# Altium footprint library Package_DFN_QFN.PcbLib: 557 footprints (part 9 of 35)
Each footprint in its own frame and in the unit in brackets; x right, y up, seen from the top. Pads: shape width x height; smd on the part's side, far side on the other; paste and mask are expansions set on the pad; w line width, h text height; cw(c..) or ccw(c..) is an arc to the next point about the centre after c.
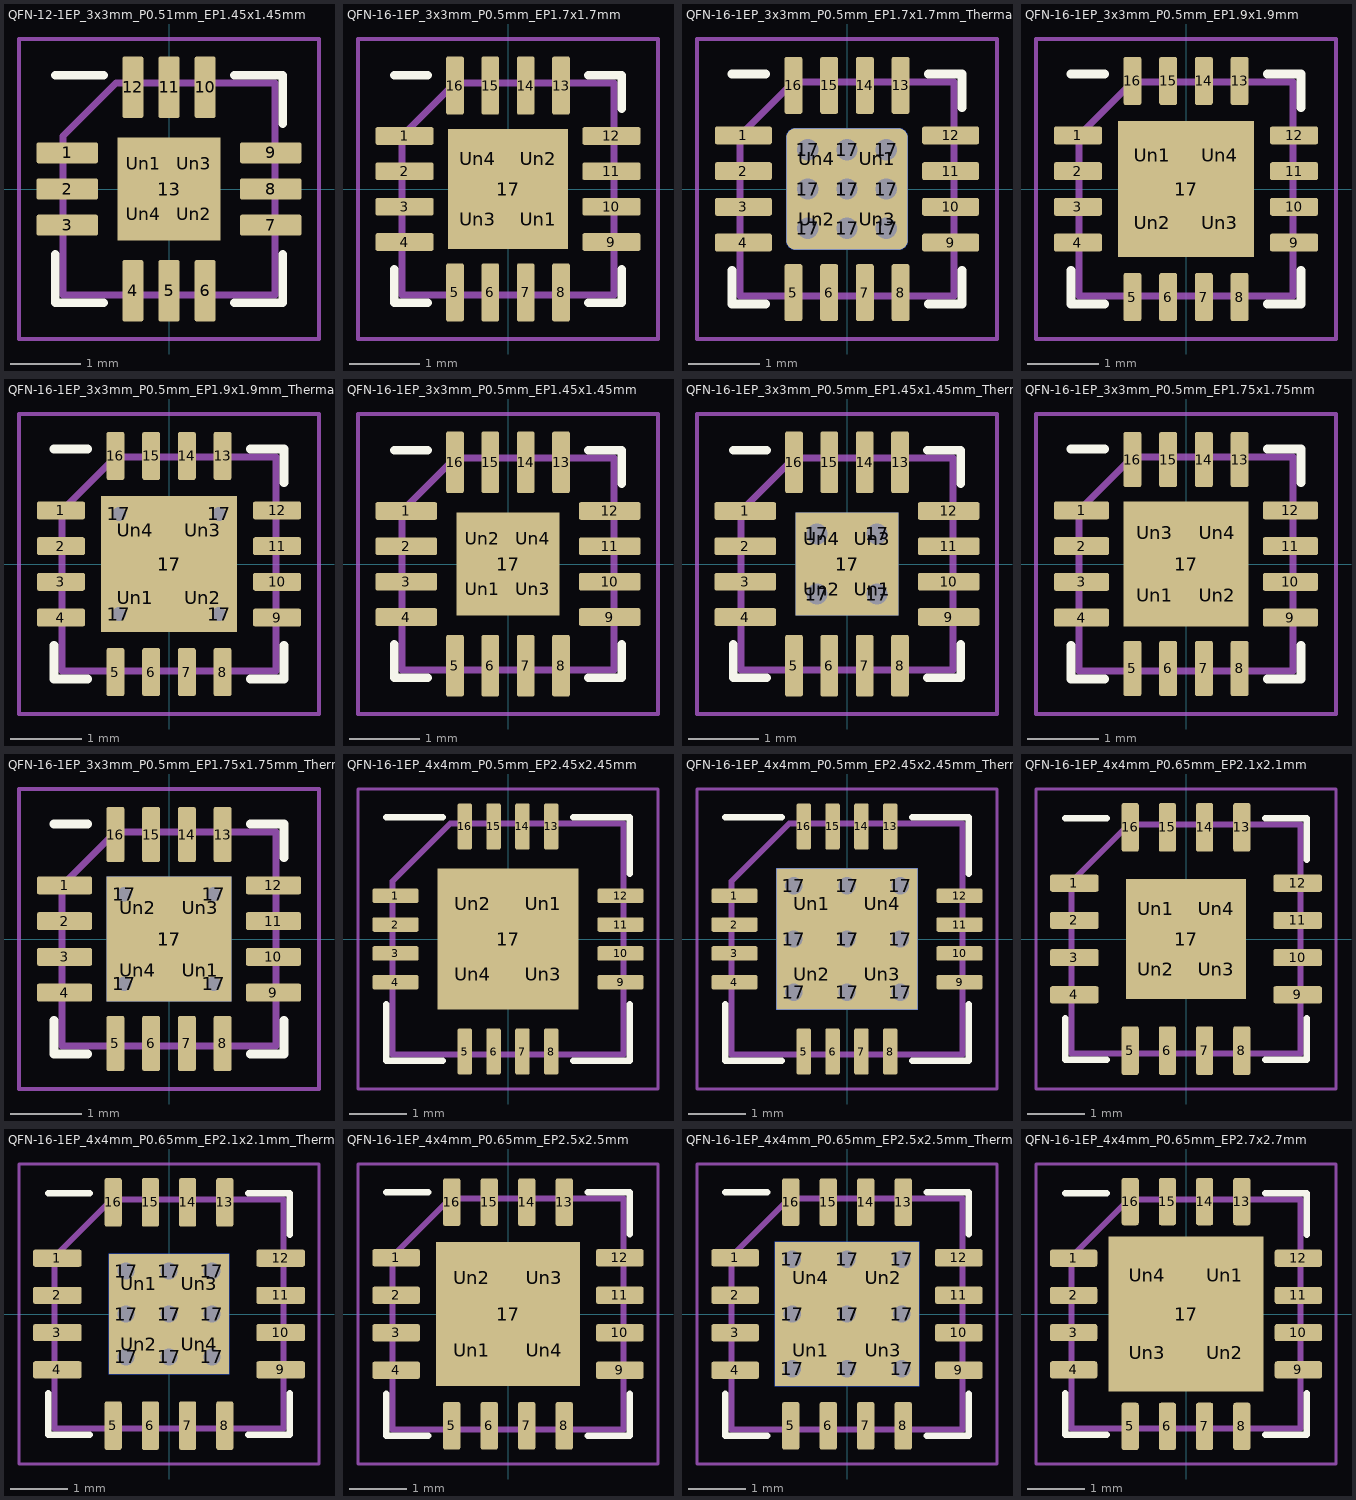
[diagram p8: the footprints below, top view; thin cyan lines are the x and y axes]

## QFN-12-1EP_3x3mm_P0.51mm_EP1.45x1.45mm [mm]
pads (17):
  rrect25% 0.875x0.3 smd: 1(-1.438,0.51) 2(-1.438,0) 3(-1.438,-0.51) 7(1.438,-0.51) 8(1.438,0) 9(1.438,0.51)
  rrect25% 0.3x0.875 smd: 4(-0.51,-1.438) 5(0,-1.438) 6(0.51,-1.438) 10(0.51,1.438) 11(0,1.438) 12(-0.51,1.438)
  rect 1.45x1.45 smd: 13(0,0)
  rrect25% 0.58x0.58 on Top Paste: Un1(-0.36,0.36) Un2(0.36,-0.36) Un3(0.36,0.36) Un4(-0.36,-0.36)
F.SilkS:
  lines w0.12: -1.61,-0.92 -1.61,-1.61 -0.92,-1.61 ; -1.61,1.61 -0.92,1.61 ; 0.92,-1.61 1.61,-1.61 1.61,-0.92 ; 0.92,1.61 1.61,1.61 1.61,0.92
F.CrtYd:
  lines w0.05: -2.12,-2.12 -2.12,2.12 2.12,2.12 2.12,-2.12 -2.12,-2.12
F.Fab:
  lines w0.1: -1.5,-1.5 -1.5,0.75 -0.75,1.5 1.5,1.5 1.5,-1.5 -1.5,-1.5
  text "'.Designator'" at -3.033,-0.628 h0.75

## QFN-16-1EP_3x3mm_P0.5mm_EP1.7x1.7mm [mm]
pads (21):
  rrect25% 0.825x0.25 smd: 1(-1.462,0.75) 2(-1.462,0.25) 3(-1.462,-0.25) 4(-1.462,-0.75) 9(1.462,-0.75) 10(1.462,-0.25) 11(1.462,0.25) 12(1.462,0.75)
  rrect25% 0.25x0.825 smd: 5(-0.75,-1.462) 6(-0.25,-1.462) 7(0.25,-1.462) 8(0.75,-1.462) 13(0.75,1.462) 14(0.25,1.462) 15(-0.25,1.462) 16(-0.75,1.462)
  rect 1.7x1.7 smd: 17(0,0)
  rrect25% 0.69x0.69 on Top Paste: Un1(0.425,-0.425) Un2(0.425,0.425) Un3(-0.425,-0.425) Un4(-0.425,0.425)
F.SilkS:
  lines w0.12: -1.61,-1.135 -1.61,-1.61 -1.135,-1.61 ; -1.61,1.61 -1.135,1.61 ; 1.135,-1.61 1.61,-1.61 1.61,-1.135 ; 1.135,1.61 1.61,1.61 1.61,1.135
F.CrtYd:
  lines w0.05: -2.12,-2.12 -2.12,2.12 2.12,2.12 2.12,-2.12 -2.12,-2.12
F.Fab:
  lines w0.1: -1.5,-1.5 -1.5,0.75 -0.75,1.5 1.5,1.5 1.5,-1.5 -1.5,-1.5
  text "'.Designator'" at -3.033,-0.628 h0.75

## QFN-16-1EP_3x3mm_P0.5mm_EP1.7x1.7mm_ThermalVias [mm]
pads (31):
  rrect25% 0.8x0.25 smd: 1(-1.45,0.75) 2(-1.45,0.25) 3(-1.45,-0.25) 4(-1.45,-0.75) 9(1.45,-0.75) 10(1.45,-0.25) 11(1.45,0.25) 12(1.45,0.75)
  rrect25% 0.25x0.8 smd: 5(-0.75,-1.45) 6(-0.25,-1.45) 7(0.25,-1.45) 8(0.75,-1.45) 13(0.75,1.45) 14(0.25,1.45) 15(-0.25,1.45) 16(-0.75,1.45)
  round 0.6 hole 0.3: 17(-0.55,-0.55) 17(-0.55,0) 17(-0.55,0.55) 17(0,-0.55) 17(0,0) 17(0,0.55) 17(0.55,-0.55) 17(0.55,0) 17(0.55,0.55)
  rrect15% 1.7x1.7 smd far side: 17(0,0)
  rrect15% 1.7x1.7 smd: 17(0,0)
  rrect25% 0.74x0.74 on Top Paste: Un1(0.425,0.425) Un2(-0.425,-0.425) Un3(0.425,-0.425) Un4(-0.425,0.425)
F.SilkS:
  lines w0.12: -1.61,-1.135 -1.61,-1.61 -1.135,-1.61 ; -1.61,1.61 -1.135,1.61 ; 1.135,-1.61 1.61,-1.61 1.61,-1.135 ; 1.135,1.61 1.61,1.61 1.61,1.135
F.CrtYd:
  lines w0.05: -2.1,-2.1 -2.1,2.1 2.1,2.1 2.1,-2.1 -2.1,-2.1
F.Fab:
  lines w0.1: -1.5,-1.5 -1.5,0.75 -0.75,1.5 1.5,1.5 1.5,-1.5 -1.5,-1.5
  text "'.Designator'" at -3.033,-0.628 h0.75

## QFN-16-1EP_3x3mm_P0.5mm_EP1.9x1.9mm [mm]
pads (21):
  rrect25% 0.675x0.25 smd: 1(-1.512,0.75) 2(-1.512,0.25) 3(-1.512,-0.25) 4(-1.512,-0.75) 9(1.512,-0.75) 10(1.512,-0.25) 11(1.512,0.25) 12(1.512,0.75)
  rrect25% 0.25x0.675 smd: 5(-0.75,-1.512) 6(-0.25,-1.512) 7(0.25,-1.512) 8(0.75,-1.512) 13(0.75,1.512) 14(0.25,1.512) 15(-0.25,1.512) 16(-0.75,1.512)
  rect 1.9x1.9 smd: 17(0,0)
  rrect25% 0.77x0.77 on Top Paste: Un1(-0.475,0.475) Un2(-0.475,-0.475) Un3(0.475,-0.475) Un4(0.475,0.475)
F.SilkS:
  lines w0.12: -1.61,-1.135 -1.61,-1.61 -1.135,-1.61 ; -1.61,1.61 -1.135,1.61 ; 1.135,-1.61 1.61,-1.61 1.61,-1.135 ; 1.135,1.61 1.61,1.61 1.61,1.135
F.CrtYd:
  lines w0.05: -2.1,-2.1 -2.1,2.1 2.1,2.1 2.1,-2.1 -2.1,-2.1
F.Fab:
  lines w0.1: -1.5,-1.5 -1.5,0.75 -0.75,1.5 1.5,1.5 1.5,-1.5 -1.5,-1.5
  text "'.Designator'" at -3.033,-0.628 h0.75

## QFN-16-1EP_3x3mm_P0.5mm_EP1.9x1.9mm_ThermalVias [mm]
pads (26):
  rrect25% 0.675x0.25 smd: 1(-1.512,0.75) 2(-1.512,0.25) 3(-1.512,-0.25) 4(-1.512,-0.75) 9(1.512,-0.75) 10(1.512,-0.25) 11(1.512,0.25) 12(1.512,0.75)
  rrect25% 0.25x0.675 smd: 5(-0.75,-1.512) 6(-0.25,-1.512) 7(0.25,-1.512) 8(0.75,-1.512) 13(0.75,1.512) 14(0.25,1.512) 15(-0.25,1.512) 16(-0.75,1.512)
  round 0.5 hole 0.2: 17(-0.7,-0.7) 17(-0.7,0.7) 17(0.7,-0.7) 17(0.7,0.7)
  rect 1.9x1.9 smd far side: 17(0,0)
  rect 1.9x1.9 smd: 17(0,0)
  rrect25% 0.82x0.82 on Top Paste: Un1(-0.475,-0.475) Un2(0.475,-0.475) Un3(0.475,0.475) Un4(-0.475,0.475)
F.SilkS:
  lines w0.12: -1.61,-1.135 -1.61,-1.61 -1.135,-1.61 ; -1.61,1.61 -1.135,1.61 ; 1.135,-1.61 1.61,-1.61 1.61,-1.135 ; 1.135,1.61 1.61,1.61 1.61,1.135
F.CrtYd:
  lines w0.05: -2.1,-2.1 -2.1,2.1 2.1,2.1 2.1,-2.1 -2.1,-2.1
F.Fab:
  lines w0.1: -1.5,-1.5 -1.5,0.75 -0.75,1.5 1.5,1.5 1.5,-1.5 -1.5,-1.5
  text "'.Designator'" at -3.033,-0.628 h0.75

## QFN-16-1EP_3x3mm_P0.5mm_EP1.45x1.45mm [mm]
pads (21):
  rrect25% 0.875x0.25 smd: 1(-1.438,0.75) 2(-1.438,0.25) 3(-1.438,-0.25) 4(-1.438,-0.75) 9(1.438,-0.75) 10(1.438,-0.25) 11(1.438,0.25) 12(1.438,0.75)
  rrect25% 0.25x0.875 smd: 5(-0.75,-1.438) 6(-0.25,-1.438) 7(0.25,-1.438) 8(0.75,-1.438) 13(0.75,1.438) 14(0.25,1.438) 15(-0.25,1.438) 16(-0.75,1.438)
  rect 1.45x1.45 smd: 17(0,0)
  rrect25% 0.58x0.58 on Top Paste: Un1(-0.36,-0.36) Un2(-0.36,0.36) Un3(0.36,-0.36) Un4(0.36,0.36)
F.SilkS:
  lines w0.12: -1.61,-1.135 -1.61,-1.61 -1.135,-1.61 ; -1.61,1.61 -1.135,1.61 ; 1.135,-1.61 1.61,-1.61 1.61,-1.135 ; 1.135,1.61 1.61,1.61 1.61,1.135
F.CrtYd:
  lines w0.05: -2.12,-2.12 2.12,-2.12 2.12,2.12 -2.12,2.12 -2.12,-2.12
F.Fab:
  lines w0.1: -1.5,-1.5 -1.5,0.75 -0.75,1.5 1.5,1.5 1.5,-1.5 -1.5,-1.5
  text "'.Designator'" at -3.033,-0.628 h0.75

## QFN-16-1EP_3x3mm_P0.5mm_EP1.45x1.45mm_ThermalVias [mm]
pads (26):
  rrect25% 0.875x0.25 smd: 1(-1.438,0.75) 2(-1.438,0.25) 3(-1.438,-0.25) 4(-1.438,-0.75) 9(1.438,-0.75) 10(1.438,-0.25) 11(1.438,0.25) 12(1.438,0.75)
  rrect25% 0.25x0.875 smd: 5(-0.75,-1.438) 6(-0.25,-1.438) 7(0.25,-1.438) 8(0.75,-1.438) 13(0.75,1.438) 14(0.25,1.438) 15(-0.25,1.438) 16(-0.75,1.438)
  round 0.6 hole 0.3: 17(-0.425,-0.425) 17(-0.425,0.425) 17(0.425,-0.425) 17(0.425,0.425)
  rect 1.45x1.45 smd: 17(0,0)
  rect 1.45x1.45 smd far side: 17(0,0)
  rrect25% 0.63x0.63 on Top Paste: Un1(0.36,-0.36) Un2(-0.36,-0.36) Un3(0.36,0.36) Un4(-0.36,0.36)
F.SilkS:
  lines w0.12: -1.61,-1.135 -1.61,-1.61 -1.135,-1.61 ; -1.61,1.61 -1.135,1.61 ; 1.135,-1.61 1.61,-1.61 1.61,-1.135 ; 1.135,1.61 1.61,1.61 1.61,1.135
F.CrtYd:
  lines w0.05: -2.12,-2.12 -2.12,2.12 2.12,2.12 2.12,-2.12 -2.12,-2.12
F.Fab:
  lines w0.1: -1.5,-1.5 -1.5,0.75 -0.75,1.5 1.5,1.5 1.5,-1.5 -1.5,-1.5
  text "'.Designator'" at -3.033,-0.628 h0.75

## QFN-16-1EP_3x3mm_P0.5mm_EP1.75x1.75mm [mm]
pads (21):
  rrect25% 0.775x0.25 smd: 1(-1.462,0.75) 2(-1.462,0.25) 3(-1.462,-0.25) 4(-1.462,-0.75) 9(1.462,-0.75) 10(1.462,-0.25) 11(1.462,0.25) 12(1.462,0.75)
  rrect25% 0.25x0.775 smd: 5(-0.75,-1.462) 6(-0.25,-1.462) 7(0.25,-1.462) 8(0.75,-1.462) 13(0.75,1.462) 14(0.25,1.462) 15(-0.25,1.462) 16(-0.75,1.462)
  rect 1.75x1.75 smd: 17(0,0)
  rrect25% 0.71x0.71 on Top Paste: Un1(-0.44,-0.44) Un2(0.44,-0.44) Un3(-0.44,0.44) Un4(0.44,0.44)
F.SilkS:
  lines w0.12: -1.61,-1.135 -1.61,-1.61 -1.135,-1.61 ; -1.61,1.61 -1.135,1.61 ; 1.135,-1.61 1.61,-1.61 1.61,-1.135 ; 1.135,1.61 1.61,1.61 1.61,1.135
F.CrtYd:
  lines w0.05: -2.1,-2.1 -2.1,2.1 2.1,2.1 2.1,-2.1 -2.1,-2.1
F.Fab:
  lines w0.1: -1.5,-1.5 -1.5,0.75 -0.75,1.5 1.5,1.5 1.5,-1.5 -1.5,-1.5
  text "'.Designator'" at -3.033,-0.628 h0.75

## QFN-16-1EP_3x3mm_P0.5mm_EP1.75x1.75mm_ThermalVias [mm]
pads (26):
  rrect25% 0.775x0.25 smd: 1(-1.462,0.75) 2(-1.462,0.25) 3(-1.462,-0.25) 4(-1.462,-0.75) 9(1.462,-0.75) 10(1.462,-0.25) 11(1.462,0.25) 12(1.462,0.75)
  rrect25% 0.25x0.775 smd: 5(-0.75,-1.462) 6(-0.25,-1.462) 7(0.25,-1.462) 8(0.75,-1.462) 13(0.75,1.462) 14(0.25,1.462) 15(-0.25,1.462) 16(-0.75,1.462)
  round 0.5 hole 0.2: 17(-0.625,-0.625) 17(-0.625,0.625) 17(0.625,-0.625) 17(0.625,0.625)
  rect 1.75x1.75 smd: 17(0,0)
  rect 1.75x1.75 smd far side: 17(0,0)
  rrect25% 0.76x0.76 on Top Paste: Un1(0.44,-0.44) Un2(-0.44,0.44) Un3(0.44,0.44) Un4(-0.44,-0.44)
F.SilkS:
  lines w0.12: -1.61,-1.135 -1.61,-1.61 -1.135,-1.61 ; -1.61,1.61 -1.135,1.61 ; 1.135,-1.61 1.61,-1.61 1.61,-1.135 ; 1.135,1.61 1.61,1.61 1.61,1.135
F.CrtYd:
  lines w0.05: -2.1,-2.1 2.1,-2.1 2.1,2.1 -2.1,2.1 -2.1,-2.1
F.Fab:
  lines w0.1: -1.5,-1.5 -1.5,0.75 -0.75,1.5 1.5,1.5 1.5,-1.5 -1.5,-1.5
  text "'.Designator'" at -3.033,-0.628 h0.75

## QFN-16-1EP_4x4mm_P0.5mm_EP2.45x2.45mm [mm]
pads (21):
  rrect25% 0.8x0.25 smd: 1(-1.95,0.75) 2(-1.95,0.25) 3(-1.95,-0.25) 4(-1.95,-0.75) 9(1.95,-0.75) 10(1.95,-0.25) 11(1.95,0.25) 12(1.95,0.75)
  rrect25% 0.25x0.8 smd: 5(-0.75,-1.95) 6(-0.25,-1.95) 7(0.25,-1.95) 8(0.75,-1.95) 13(0.75,1.95) 14(0.25,1.95) 15(-0.25,1.95) 16(-0.75,1.95)
  rect 2.45x2.45 smd: 17(0,0)
  rrect25% 0.99x0.99 on Top Paste: Un1(0.61,0.61) Un2(-0.61,0.61) Un3(0.61,-0.61) Un4(-0.61,-0.61)
F.SilkS:
  lines w0.12: -2.11,-1.135 -2.11,-2.11 -1.135,-2.11 ; -2.11,2.11 -1.135,2.11 ; 1.135,-2.11 2.11,-2.11 2.11,-1.135 ; 1.135,2.11 2.11,2.11 2.11,1.135
F.CrtYd:
  lines w0.05: -2.6,-2.6 2.6,-2.6 2.6,2.6 -2.6,2.6 -2.6,-2.6
F.Fab:
  lines w0.1: -2,-2 -2,1 -1,2 2,2 2,-2 -2,-2
  text "'.Designator'" at -4.047,-0.84 h1

## QFN-16-1EP_4x4mm_P0.5mm_EP2.45x2.45mm_ThermalVias [mm]
pads (31):
  rrect25% 0.8x0.25 smd: 1(-1.95,0.75) 2(-1.95,0.25) 3(-1.95,-0.25) 4(-1.95,-0.75) 9(1.95,-0.75) 10(1.95,-0.25) 11(1.95,0.25) 12(1.95,0.75)
  rrect25% 0.25x0.8 smd: 5(-0.75,-1.95) 6(-0.25,-1.95) 7(0.25,-1.95) 8(0.75,-1.95) 13(0.75,1.95) 14(0.25,1.95) 15(-0.25,1.95) 16(-0.75,1.95)
  round 0.6 hole 0.3: 17(-0.925,-0.925) 17(-0.925,0) 17(-0.925,0.925) 17(0,-0.925) 17(0,0) 17(0,0.925) 17(0.925,-0.925) 17(0.925,0) 17(0.925,0.925)
  rect 2.45x2.45 smd far side: 17(0,0)
  rect 2.45x2.45 smd: 17(0,0)
  rrect24% 1.06x1.06 on Top Paste: Un1(-0.61,0.61) Un2(-0.61,-0.61) Un3(0.61,-0.61) Un4(0.61,0.61)
F.SilkS:
  lines w0.12: -2.11,-1.135 -2.11,-2.11 -1.135,-2.11 ; -2.11,2.11 -1.135,2.11 ; 1.135,-2.11 2.11,-2.11 2.11,-1.135 ; 1.135,2.11 2.11,2.11 2.11,1.135
F.CrtYd:
  lines w0.05: -2.6,-2.6 -2.6,2.6 2.6,2.6 2.6,-2.6 -2.6,-2.6
F.Fab:
  lines w0.1: -2,-2 -2,1 -1,2 2,2 2,-2 -2,-2
  text "'.Designator'" at -4.047,-0.84 h1

## QFN-16-1EP_4x4mm_P0.65mm_EP2.1x2.1mm [mm]
pads (21):
  rrect25% 0.85x0.3 smd: 1(-1.95,0.975) 2(-1.95,0.325) 3(-1.95,-0.325) 4(-1.95,-0.975) 9(1.95,-0.975) 10(1.95,-0.325) 11(1.95,0.325) 12(1.95,0.975)
  rrect25% 0.3x0.85 smd: 5(-0.975,-1.95) 6(-0.325,-1.95) 7(0.325,-1.95) 8(0.975,-1.95) 13(0.975,1.95) 14(0.325,1.95) 15(-0.325,1.95) 16(-0.975,1.95)
  rect 2.1x2.1 smd: 17(0,0)
  rrect25% 0.85x0.85 on Top Paste: Un1(-0.525,0.525) Un2(-0.525,-0.525) Un3(0.525,-0.525) Un4(0.525,0.525)
F.SilkS:
  lines w0.12: -2.11,-1.385 -2.11,-2.11 -1.385,-2.11 ; -2.11,2.11 -1.385,2.11 ; 1.385,-2.11 2.11,-2.11 2.11,-1.385 ; 1.385,2.11 2.11,2.11 2.11,1.385
F.CrtYd:
  lines w0.05: -2.62,-2.62 -2.62,2.62 2.62,2.62 2.62,-2.62 -2.62,-2.62
F.Fab:
  lines w0.1: -2,-2 -2,1 -1,2 2,2 2,-2 -2,-2
  text "'.Designator'" at -4.047,-0.84 h1

## QFN-16-1EP_4x4mm_P0.65mm_EP2.1x2.1mm_ThermalVias [mm]
pads (31):
  rrect25% 0.85x0.3 smd: 1(-1.95,0.975) 2(-1.95,0.325) 3(-1.95,-0.325) 4(-1.95,-0.975) 9(1.95,-0.975) 10(1.95,-0.325) 11(1.95,0.325) 12(1.95,0.975)
  rrect25% 0.3x0.85 smd: 5(-0.975,-1.95) 6(-0.325,-1.95) 7(0.325,-1.95) 8(0.975,-1.95) 13(0.975,1.95) 14(0.325,1.95) 15(-0.325,1.95) 16(-0.975,1.95)
  round 0.6 hole 0.3: 17(-0.75,-0.75) 17(-0.75,0) 17(-0.75,0.75) 17(0,-0.75) 17(0,0) 17(0,0.75) 17(0.75,-0.75) 17(0.75,0) 17(0.75,0.75)
  rect 2.1x2.1 smd far side: 17(0,0)
  rect 2.1x2.1 smd: 17(0,0)
  rrect25% 0.91x0.91 on Top Paste: Un1(-0.525,0.525) Un2(-0.525,-0.525) Un3(0.525,0.525) Un4(0.525,-0.525)
F.SilkS:
  lines w0.12: -2.11,-1.385 -2.11,-2.11 -1.385,-2.11 ; -2.11,2.11 -1.385,2.11 ; 1.385,-2.11 2.11,-2.11 2.11,-1.385 ; 1.385,2.11 2.11,2.11 2.11,1.385
F.CrtYd:
  lines w0.05: -2.62,-2.62 2.62,-2.62 2.62,2.62 -2.62,2.62 -2.62,-2.62
F.Fab:
  lines w0.1: -2,-2 -2,1 -1,2 2,2 2,-2 -2,-2
  text "'.Designator'" at -4.047,-0.84 h1

## QFN-16-1EP_4x4mm_P0.65mm_EP2.5x2.5mm [mm]
pads (21):
  rrect25% 0.825x0.3 smd: 1(-1.937,0.975) 2(-1.937,0.325) 3(-1.937,-0.325) 4(-1.937,-0.975) 9(1.937,-0.975) 10(1.937,-0.325) 11(1.937,0.325) 12(1.937,0.975)
  rrect25% 0.3x0.825 smd: 5(-0.975,-1.937) 6(-0.325,-1.937) 7(0.325,-1.937) 8(0.975,-1.937) 13(0.975,1.937) 14(0.325,1.937) 15(-0.325,1.937) 16(-0.975,1.937)
  rect 2.5x2.5 smd: 17(0,0)
  rrect25% 1.01x1.01 on Top Paste: Un1(-0.625,-0.625) Un2(-0.625,0.625) Un3(0.625,0.625) Un4(0.625,-0.625)
F.SilkS:
  lines w0.12: -2.11,-1.385 -2.11,-2.11 -1.385,-2.11 ; -2.11,2.11 -1.385,2.11 ; 1.385,-2.11 2.11,-2.11 2.11,-1.385 ; 1.385,2.11 2.11,2.11 2.11,1.385
F.CrtYd:
  lines w0.05: -2.6,-2.6 2.6,-2.6 2.6,2.6 -2.6,2.6 -2.6,-2.6
F.Fab:
  lines w0.1: -2,-2 2,-2 2,2 -1,2 -2,1 -2,-2
  text "'.Designator'" at -4.047,-0.84 h1

## QFN-16-1EP_4x4mm_P0.65mm_EP2.5x2.5mm_ThermalVias [mm]
pads (31):
  rrect25% 0.825x0.3 smd: 1(-1.937,0.975) 2(-1.937,0.325) 3(-1.937,-0.325) 4(-1.937,-0.975) 9(1.937,-0.975) 10(1.937,-0.325) 11(1.937,0.325) 12(1.937,0.975)
  rrect25% 0.3x0.825 smd: 5(-0.975,-1.937) 6(-0.325,-1.937) 7(0.325,-1.937) 8(0.975,-1.937) 13(0.975,1.937) 14(0.325,1.937) 15(-0.325,1.937) 16(-0.975,1.937)
  round 0.6 hole 0.3: 17(-0.95,-0.95) 17(-0.95,0) 17(-0.95,0.95) 17(0,-0.95) 17(0,0) 17(0,0.95) 17(0.95,-0.95) 17(0.95,0) 17(0.95,0.95)
  rect 2.5x2.5 smd far side: 17(0,0)
  rect 2.5x2.5 smd: 17(0,0)
  rrect23% 1.08x1.08 on Top Paste: Un1(-0.625,-0.625) Un2(0.625,0.625) Un3(0.625,-0.625) Un4(-0.625,0.625)
F.SilkS:
  lines w0.12: -2.11,-1.385 -2.11,-2.11 -1.385,-2.11 ; -2.11,2.11 -1.385,2.11 ; 1.385,-2.11 2.11,-2.11 2.11,-1.385 ; 1.385,2.11 2.11,2.11 2.11,1.385
F.CrtYd:
  lines w0.05: -2.6,-2.6 2.6,-2.6 2.6,2.6 -2.6,2.6 -2.6,-2.6
F.Fab:
  lines w0.1: -2,-2 -2,1 -1,2 2,2 2,-2 -2,-2
  text "'.Designator'" at -4.047,-0.84 h1

## QFN-16-1EP_4x4mm_P0.65mm_EP2.7x2.7mm [mm]
pads (21):
  rrect25% 0.825x0.3 smd: 1(-1.963,0.975) 2(-1.963,0.325) 3(-1.963,-0.325) 4(-1.963,-0.975) 9(1.963,-0.975) 10(1.963,-0.325) 11(1.963,0.325) 12(1.963,0.975)
  rrect25% 0.3x0.825 smd: 5(-0.975,-1.963) 6(-0.325,-1.963) 7(0.325,-1.963) 8(0.975,-1.963) 13(0.975,1.963) 14(0.325,1.963) 15(-0.325,1.963) 16(-0.975,1.963)
  rect 2.7x2.7 smd: 17(0,0)
  rrect23% 1.09x1.09 on Top Paste: Un1(0.675,0.675) Un2(0.675,-0.675) Un3(-0.675,-0.675) Un4(-0.675,0.675)
F.SilkS:
  lines w0.12: -2.11,-1.385 -2.11,-2.11 -1.385,-2.11 ; -2.11,2.11 -1.385,2.11 ; 1.385,-2.11 2.11,-2.11 2.11,-1.385 ; 1.385,2.11 2.11,2.11 2.11,1.385
F.CrtYd:
  lines w0.05: -2.62,-2.62 -2.62,2.62 2.62,2.62 2.62,-2.62 -2.62,-2.62
F.Fab:
  lines w0.1: -2,-2 2,-2 2,2 -1,2 -2,1 -2,-2
  text "'.Designator'" at -4.047,-0.84 h1